# Altium footprint library 9-Pcblib_Con.PcbLib: 266 footprints (part 10 of 17)
Each footprint in its own frame and in the unit in brackets; x right, y up, seen from the top. Pads: shape width x height; smd on the part's side, far side on the other; paste and mask are expansions set on the pad; w line width, h text height; cw(c..) or ccw(c..) is an arc to the next point about the centre after c.
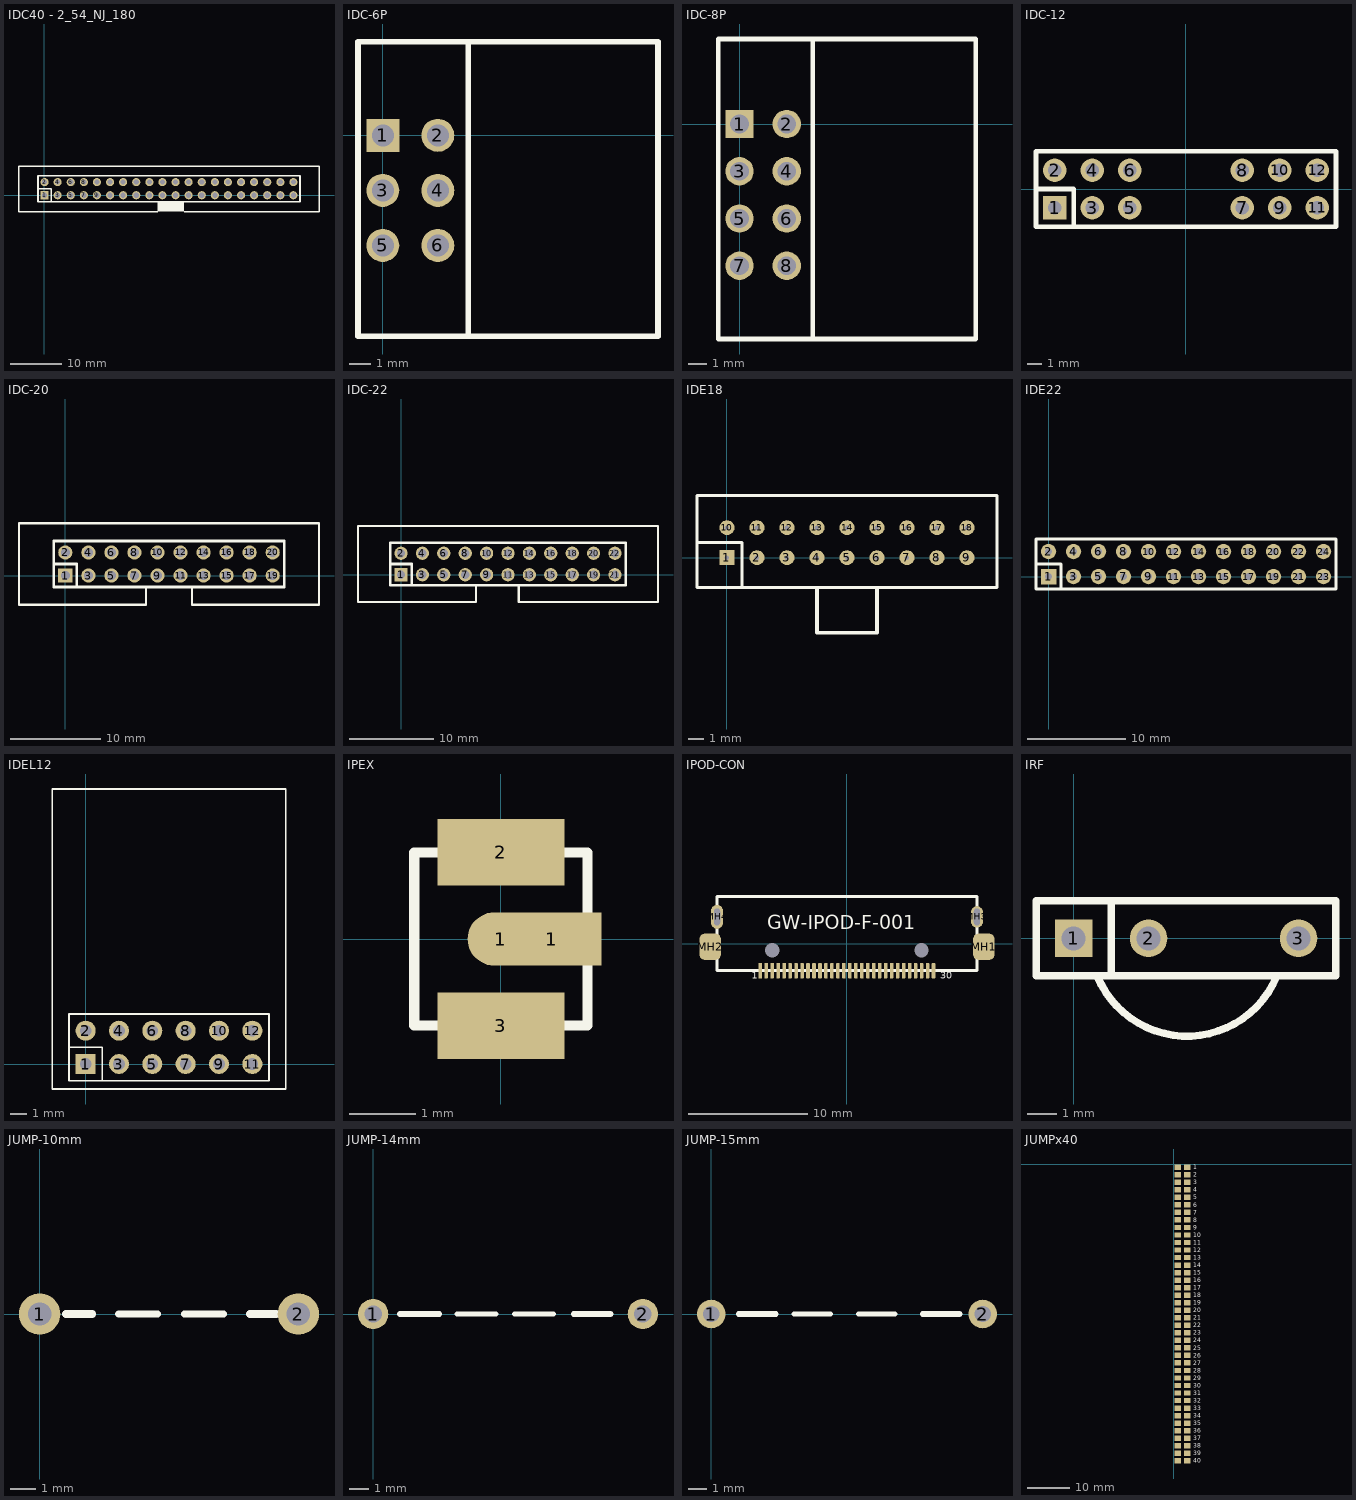
[diagram p9: the footprints below, top view; thin cyan lines are the x and y axes]

## IDC40 - 2_54_NJ_180 [mil]
pads (40):
  rect 62x62 hole 39: 1(0.48,0)
  round 62 hole 39: 2(0.48,100) 3(100.48,0) 4(100.48,100) 5(200.48,0) 6(200.48,100) 7(300.48,0) 8(300.48,100) 9(400.48,0) 10(400.48,100) 11(500.48,0) 12(500.48,100) 13(600.48,0) 14(600.48,100) 15(700.48,0) 16(700.48,100) 17(800.48,0) 18(800.48,100) 19(900.48,0) 20(900.48,100) 21(1000.48,0) 22(1000.48,100) 23(1100.48,0) 24(1100.48,100) 25(1200.48,0) 26(1200.48,100) 27(1300.48,0) 28(1300.48,100) 29(1400.48,0) 30(1400.48,100) 31(1500.48,0) 32(1500.48,100) 33(1600.48,0) 34(1600.48,100) 35(1700.48,0) 36(1700.48,100) 37(1800.48,0) 38(1800.48,100) 39(1900.48,0) 40(1900.48,100)
Top Overlay:
  rectangle: 864,-125 1066,-50
  lines w10: 864,-125 -194.52,-125 -194.52,220 2095.48,220 2095.48,-125 1066,-125
  lines w12: -49.52,50 50.48,50 50.48,-50 ; -49.52,-50 1950.48,-50 1950.48,150 -49.52,150 -49.52,-50
3D body: height 1035, standoff -105, extent -464.51,-130 2365.48,230

## IDC-6P [mil]
pads (6):
  rect 60x60 hole 40: 1(0,0)
  round 60 hole 40: 2(100,0) 3(0,-100) 4(100,-100) 5(0,-200) 6(100,-200)
Top Overlay:
  lines w10: 155,-365 155,170 ; 498.31,170 -45,170 -45,-365 500,-365 500,170

## IDC-8P [mil]
pads (8):
  rect 60x60 hole 40: 1(0,0)
  round 60 hole 40: 2(100,0) 3(0,-100) 4(100,-100) 5(0,-200) 6(100,-200) 7(0,-300) 8(100,-300)
Top Overlay:
  lines w10: 155,-455 155,180 ; 498.31,180 -45,180 -45,-455 500,-455 500,180

## IDC-12 [mil]
height 338.58
pads (12):
  rect 62x62 hole 35: 1(-350,-50)
  round 62 hole 35: 2(-350,50) 3(-250,-50) 4(-250,50) 5(-150,-50) 6(-150,50) 7(150,-50) 8(150,50) 9(250,-50) 10(250,50) 11(350,-50) 12(350,50)
Top Overlay:
  lines w12: -400,0 -300,0 -300,-100 ; -400,-100 -400,100 400,100 400,-100 -400,-100
3D body: height 920, standoff -110, extent -400,-100 -100,100
3D body: height 920, standoff -110, extent 100,-100 400,100

## IDC-20 [mil]
pads (20):
  rect 62x62 hole 39.37: 1(0,0)
  round 62 hole 39.37: 2(0,100) 3(100,0) 4(100,100) 5(200,0) 6(200,100) 7(300,0) 8(300,100) 9(400,0) 10(400,100) 11(500,0) 12(500,100) 13(600,0) 14(600,100) 15(700,0) 16(700,100) 17(800,0) 18(800,100) 19(900,0) 20(900,100)
Top Overlay:
  lines w10: 350,-50 350,-127.17 -201.18,-127.17 -201.18,227.16 1101.18,227.16 1101.18,-127.17 550,-127.17 550,-50
  lines w12: -50,50 50,50 50,-50 ; -50,-50 -50,150 950,150 950,-50 -50,-50
3D body: height 352.36, standoff -114.17, extent -201,-123.27 1099,235

## IDC-22 [mil]
pads (22):
  rect 62x62 hole 39.37: 1(0,0)
  round 62 hole 39.37: 2(0,100) 3(100,0) 4(100,100) 5(200,0) 6(200,100) 7(300,0) 8(300,100) 9(400,0) 10(400,100) 11(500,0) 12(500,100) 13(600,0) 14(600,100) 15(700,0) 16(700,100) 17(800,0) 18(800,100) 19(900,0) 20(900,100) 21(1000,0) 22(1000,100)
Top Overlay:
  lines w10: 350,-50 350,-127.17 -201.18,-127.17 -201.18,227.16 1201.18,227.16 1201.18,-127.17 550,-127.17 550,-50
  lines w12: -50,50 50,50 50,-50 ; -50,-50 1050,-50 1050,150 -50,150 -50,-50

## IDE18 [mm]
pads (18):
  rect 1x1 hole 0.3: 1(0,0)
  round 1 hole 0.3: 2(2,0) 3(4,0) 4(6,0) 5(8,0) 6(10,0) 7(12,0) 8(14,0) 9(16,0) 10(0,2) 11(2,2) 12(4,2) 13(6,2) 14(8,2) 15(10,2) 16(12,2) 17(14,2) 18(16,2)
Top Overlay:
  lines w0.2: -2,1 1,1 1,-2 ; -2,-2 18,-2 18,4.16 -2,4.16 -2,-2
  lines w0.254: 6,-2 6,-5 10,-5 10,-2

## IDE22 [mil]
pads (24):
  rect 62x62 hole 28: 1(0,0)
  round 62 hole 28: 2(0,100) 3(100,0) 4(100,100) 5(200,0) 6(200,100) 7(300,0) 8(300,100) 9(400,0) 10(400,100) 11(500,0) 12(500,100) 13(600,0) 14(600,100) 15(700,0) 16(700,100) 17(800,0) 18(800,100) 19(900,0) 20(900,100) 21(1000,0) 22(1000,100) 23(1100,0) 24(1100,100)
Top Overlay:
  lines w12: -50,50 50,50 50,-50 ; -50,-50 1150,-50 1150,150 -50,150 -50,-50

## IDEL12 [mm]
pads (12):
  rect 1.2x1.2 hole 0.7: 1(0,0)
  round 1.2 hole 0.7: 2(0,2) 3(2,0) 4(2,2) 5(4,0) 6(4,2) 7(6,0) 8(6,2) 9(8,0) 10(8,2) 11(10,0) 12(10,2)
Top Overlay:
  lines w0.1: -1,1 1,1 1,-1 ; -2,-1.5 -2,16.5 12,16.5 12,-1.5 -2,-1.5 ; -1,-1 -1,3 11,3 11,-1 -1,-1

## IPEX [mm]
pads (4):
  oval 1x0.8 smd: 1(0,0)
  rect 1.5x0.8 smd: 1(0.762,0)
  rect 1.9x1 smd: 2(0,1.3) 3(0,-1.3)
Top Overlay:
  lines w0.152: -1.3,-1.3 -1.3,1.3 1.3,1.3 1.3,-1.3 -1.3,-1.3

## IPOD-CON [mm]
height 2.5
pads (36):
  rect 0.3x1.3 smd: 1(-7.261,-2.25)
  rrect50% 0.3x1.3 smd: 2(-6.761,-2.25) 3(-6.261,-2.25) 4(-5.761,-2.25) 5(-5.261,-2.25) 6(-4.761,-2.25) 7(-4.261,-2.25) 8(-3.761,-2.25) 9(-3.261,-2.25) 10(-2.761,-2.25) 11(-2.261,-2.25) 12(-1.761,-2.25) 13(-1.261,-2.25) 14(-0.761,-2.25) 15(-0.261,-2.25) 16(0.239,-2.25) 17(0.739,-2.25) 18(1.239,-2.25) 19(1.739,-2.25) 20(2.239,-2.25) 21(2.739,-2.25) 22(3.239,-2.25) 23(3.739,-2.25) 24(4.239,-2.25) 25(4.739,-2.25) 26(5.239,-2.25) 27(5.739,-2.25) 28(6.239,-2.25) 29(6.739,-2.25) 30(7.239,-2.25)
  rrect50% 1.8x2.2 smd: MH1(11.45,-0.25) MH2(-11.45,-0.25)
  oval 1x1.8 hole 0.5 slot 1.4 at 90 deg: MH3(10.875,2.25)
  oval 1x2 hole 0.5 slot 1.4 at 90 deg: MH4(-10.875,2.25)
  rrect50% 0.3x0 hole 1.2: ""(-6.261,-0.55) ""(6.239,-0.55)
Top Overlay:
  lines w0.254: -10.875,-2.25 10.875,-2.25 10.875,3.95 -10.875,3.95 -10.875,-2.25
  text "1" at -7.95,-3.15 h1
  text "30" at 7.798,-3.15 h1
  text "GW-IPOD-F-001" at -6.655,0.813 h2
3D body: height 2.2, standoff 0, extent -11.409,-1.968 11.308,3.632

## IRF [mil]
pads (3):
  rect 50x50 hole 32: 1(0,0)
  round 50 hole 32: 2(100,0) 3(300,0)
Top Overlay:
  lines w10: 31.5,-50 ccw(c151.36,-0.89) 270.94,-50.69 ; 50,-50 50,50 ; -50,-50 -50,50 350,50 350,-50 -50,-50

## JUMP-10mm [mm]
pads (2):
  round 1.6 hole 0.9: 1(0,0) 2(10,0)
Top Overlay:
  lines w0.254: 3.048,0 4.572,0 ; 5.588,0 7.112,0
  lines w0.305: 1.016,0 2.032,0 ; 8.128,0 9.144,0

## JUMP-14mm [mil]
pads (2):
  round 62 hole 35.43: 1(0,0) 2(551.18,0)
Top Overlay:
  lines w10: 171,0 251,0 ; 289,0 369,0
  lines w12: 55,0 135,0 ; 410,0 485,0

## JUMP-15mm [mil]
pads (2):
  round 62 hole 35.43: 1(0,0) 2(590.55,0)
Top Overlay:
  lines w10: 180,0 260,0 ; 320,0 400,0
  lines w12: 60,0 140,0 ; 460,0 540,0

## JUMPx40 [mil]
pads (80):
  rect 60x50 smd: 1(35,-30) 2(125,-30) 3(35,-100) 4(125,-100) 5(35,-170) 6(125,-170) 7(35,-240) 8(125,-240) 9(35,-310) 10(125,-310) 11(35,-380) 12(125,-380) 13(35,-450) 14(125,-450) 15(35,-520) 16(125,-520) 17(35,-590) 18(125,-590) 19(35,-660) 20(125,-660) 21(35,-730) 22(125,-730) 23(35,-800) 24(125,-800) 25(35,-870) 26(125,-870) 27(35,-940) 28(125,-940) 29(35,-1010) 30(125,-1010) 31(35,-1080) 32(125,-1080) 33(35,-1150) 34(125,-1150) 35(35,-1220) 36(125,-1220) 37(35,-1290) 38(125,-1290) 39(35,-1360) 40(125,-1360) 41(35,-1430) 42(125,-1430) 43(35,-1500) 44(125,-1500) 45(35,-1570) 46(125,-1570) 47(35,-1640) 48(125,-1640) 49(35,-1710) 50(125,-1710) 51(35,-1780) 52(125,-1780) 53(35,-1850) 54(125,-1850) 55(35,-1920) 56(125,-1920) 57(35,-1990) 58(125,-1990) 59(35,-2060) 60(125,-2060) 61(35,-2130) 62(125,-2130) 63(35,-2200) 64(125,-2200) 65(35,-2270) 66(125,-2270) 67(35,-2340) 68(125,-2340) 69(35,-2410) 70(125,-2410) 71(35,-2480) 72(125,-2480) 73(35,-2550) 74(125,-2550) 75(35,-2620) 76(125,-2620) 77(35,-2690) 78(125,-2690) 79(35,-2760) 80(125,-2760)
Top Overlay:
  text "1" at 180,-50 h39.37
  text "2" at 180,-120 h39.37
  text "4" at 180,-260 h39.37
  text "3" at 180,-190 h39.37
  text "7" at 180,-470 h39.37
  text "8" at 180,-540 h39.37
  text "6" at 180,-400 h39.37
  text "5" at 180,-330 h39.37
  text "13" at 180,-890 h39.37
  text "14" at 180,-960 h39.37
  text "16" at 180,-1100 h39.37
  text "15" at 180,-1030 h39.37
  text "11" at 180,-750 h39.37
  text "12" at 180,-820 h39.37
  text "10" at 180,-680 h39.37
  text "9" at 180,-610 h39.37
  text "25" at 180,-1730 h39.37
  text "26" at 180,-1800 h39.37
  text "28" at 180,-1940 h39.37
  text "27" at 180,-1870 h39.37
  text "31" at 180,-2150 h39.37
  text "32" at 180,-2220 h39.37
  text "30" at 180,-2080 h39.37
  text "29" at 180,-2010 h39.37
  text "21" at 180,-1450 h39.37
  text "22" at 180,-1520 h39.37
  text "24" at 180,-1660 h39.37
  text "23" at 180,-1590 h39.37
  text "19" at 180,-1310 h39.37
  text "20" at 180,-1380 h39.37
  text "18" at 180,-1240 h39.37
  text "17" at 180,-1170 h39.37
  text "37" at 180,-2570 h39.37
  text "38" at 180,-2640 h39.37
  text "40" at 180,-2780 h39.37
  text "39" at 180,-2710 h39.37
  text "35" at 180,-2430 h39.37
  text "36" at 180,-2500 h39.37
  text "34" at 180,-2360 h39.37
  text "33" at 180,-2290 h39.37
3D body: height 21.65, standoff 0, extent 41,-55 119.74,-5.39
3D body: height 21.65, standoff 0, extent 41,-125 119.74,-75.39
3D body: height 21.65, standoff 0, extent 41,-265 119.74,-215.39
3D body: height 21.65, standoff 0, extent 41,-195 119.74,-145.39
3D body: height 21.65, standoff 0, extent 41,-475 119.74,-425.39
3D body: height 21.65, standoff 0, extent 41,-545 119.74,-495.39
3D body: height 21.65, standoff 0, extent 41,-405 119.74,-355.39
3D body: height 21.65, standoff 0, extent 41,-335 119.74,-285.39
3D body: height 21.65, standoff 0, extent 41,-895 119.74,-845.39
3D body: height 21.65, standoff 0, extent 41,-965 119.74,-915.39
3D body: height 21.65, standoff 0, extent 41,-1105 119.74,-1055.39
3D body: height 21.65, standoff 0, extent 41,-1035 119.74,-985.39
3D body: height 21.65, standoff 0, extent 41,-755 119.74,-705.39
3D body: height 21.65, standoff 0, extent 41,-825 119.74,-775.39
3D body: height 21.65, standoff 0, extent 41,-685 119.74,-635.39
3D body: height 21.65, standoff 0, extent 41,-615 119.74,-565.39
3D body: height 21.65, standoff 0, extent 41,-1735 119.74,-1685.39
3D body: height 21.65, standoff 0, extent 41,-1805 119.74,-1755.39
3D body: height 21.65, standoff 0, extent 41,-1945 119.74,-1895.39
3D body: height 21.65, standoff 0, extent 41,-1875 119.74,-1825.39
3D body: height 21.65, standoff 0, extent 41,-2155 119.74,-2105.39
3D body: height 21.65, standoff 0, extent 41,-2225 119.74,-2175.39
3D body: height 21.65, standoff 0, extent 41,-2085 119.74,-2035.39
3D body: height 21.65, standoff 0, extent 41,-2015 119.74,-1965.39
3D body: height 21.65, standoff 0, extent 41,-1455 119.74,-1405.39
3D body: height 21.65, standoff 0, extent 41,-1525 119.74,-1475.39
3D body: height 21.65, standoff 0, extent 41,-1665 119.74,-1615.39
3D body: height 21.65, standoff 0, extent 41,-1595 119.74,-1545.39
3D body: height 21.65, standoff 0, extent 41,-1315 119.74,-1265.39
3D body: height 21.65, standoff 0, extent 41,-1385 119.74,-1335.39
3D body: height 21.65, standoff 0, extent 41,-1245 119.74,-1195.39
3D body: height 21.65, standoff 0, extent 41,-1175 119.74,-1125.39
3D body: height 21.65, standoff 0, extent 41,-2575 119.74,-2525.39
3D body: height 21.65, standoff 0, extent 41,-2645 119.74,-2595.39
3D body: height 21.65, standoff 0, extent 41,-2785 119.74,-2735.39
3D body: height 21.65, standoff 0, extent 41,-2715 119.74,-2665.39
3D body: height 21.65, standoff 0, extent 41,-2435 119.74,-2385.39
3D body: height 21.65, standoff 0, extent 41,-2505 119.74,-2455.39
3D body: height 21.65, standoff 0, extent 41,-2365 119.74,-2315.39
3D body: height 21.65, standoff 0, extent 41,-2295 119.74,-2245.39